# Altium footprint library PcbLib.PcbLib: 116 footprints (part 5 of 8)
Each footprint in its own frame and in the unit in brackets; x right, y up, seen from the top. Pads: shape width x height; smd on the part's side, far side on the other; paste and mask are expansions set on the pad; w line width, h text height; cw(c..) or ccw(c..) is an arc to the next point about the centre after c.
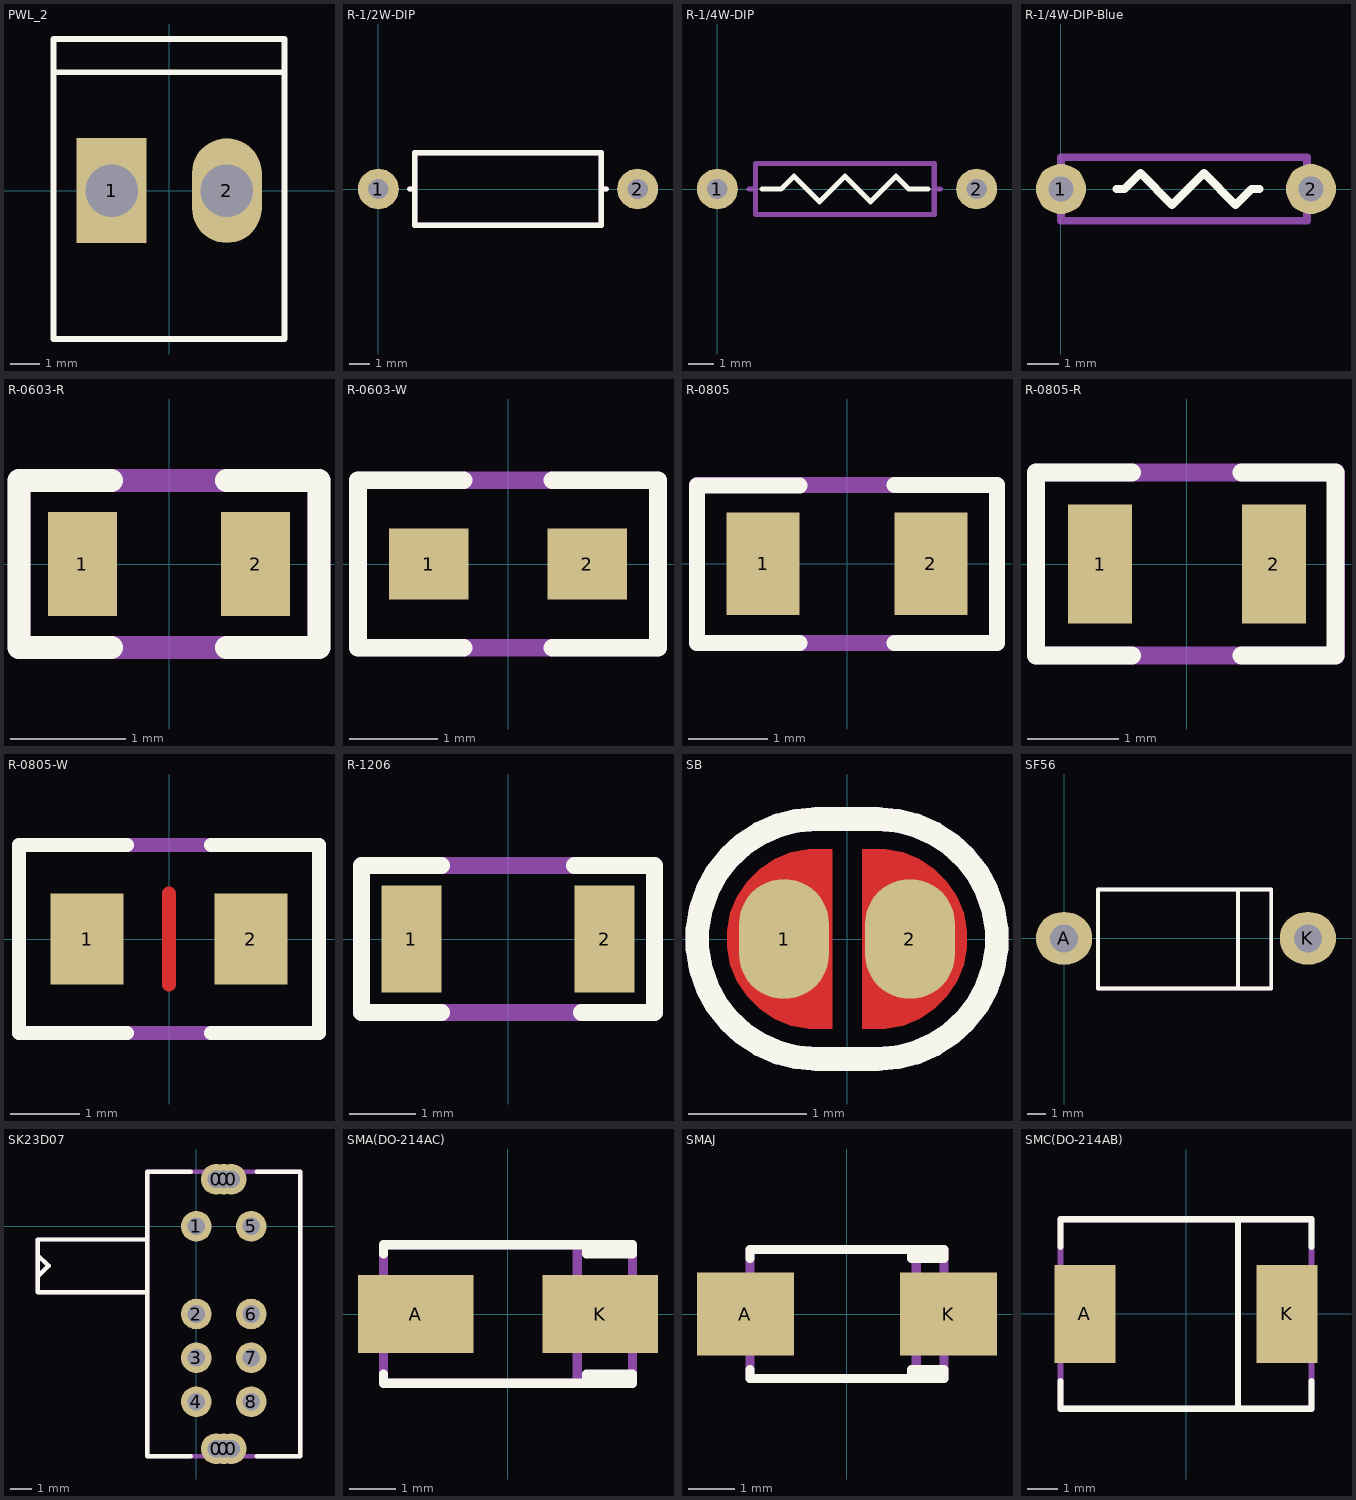
[diagram p4: the footprints below, top view; thin cyan lines are the x and y axes]

## PWL_2 [mm] "Connector; Header; 2 Position"
height 0.001
pads (2):
  rect 2.4x3.6 hole 1.8: 1(-1.98,0)
  oval 2.4x3.6 hole 1.8: 2(1.98,0)
Top Overlay:
  lines w0.2: -3.98,4.064 3.96,4.064 ; -3.98,-5.1 -3.98,5.207 3.96,5.207 3.96,-5.1 -3.98,-5.1
3D body "PWL-2.stp": height 13.5, standoff -4, extent -3.96,-5 3.96,5

## R-1/2W-DIP [mm]
pads (2):
  round 2 hole 1: 1(0,0) 2(12.7,0)
Top Overlay:
  lines w0.254: 1.524,0 1.778,0 ; 10.922,0 11.176,0 ; 1.778,-1.778 10.922,-1.778 10.922,1.778 1.778,1.778 1.778,-1.778
Mechanical 29:
  lines w0.254: 1.524,0 1.778,0 ; 10.922,0 11.176,0 ; 1.778,-1.778 10.922,-1.778 10.922,1.778 1.778,1.778 1.778,-1.778
  text ".Designator" at 4.518,-0.483 h1
3D body "User Library-Res50-Axial 0_5W-22R.step": height 4.38, standoff -5, extent -0.375,-1.875 13.075,1.875

## R-1/4W-DIP [mm]
pads (2):
  round 1.6 hole 0.8 paste+0 mask+0.04: 1(0,0) 2(10.16,0)
Top Overlay:
  lines w0.2: 1.75,0 2.5,0 3,0.5 4,-0.5 ; 8.25,0 7.5,0 ; 4,-0.5 5,0.5 6,-0.5 ; 4,-0.5 4,-0.5 ; 6,-0.5 7,0.5 7.5,0 ; 6,-0.5 6,-0.5 ; 7.5,0 7.5,0
Mechanical 29:
  lines w0.2: 1.25,0 1.5,0 ; 8.5,0 8.75,0 ; 1.5,-1 1.5,1 8.5,1 8.5,-1 1.5,-1
  text ".Designator" at 3.45,-0.467 h1
3D body "User Library-RESISTOR, 0_25 W, 0_4 IN LEAD PITCH.step": height 2.93, standoff -2.54, extent -0.305,-1.156 10.465,1.156

## R-1/4W-DIP-Blue [mm]
pads (2):
  round 1.6 hole 0.8 paste+0 mask+0.04: 1(0,0) 2(8,0)
Top Overlay:
  lines w0.254: 1.778,0 2.032,0 2.54,0.508 3.556,-0.508 4.572,0.508 5.588,-0.508 6.096,0 6.35,0
Mechanical 29:
  lines w0.254: 0,-1.016 7.874,-1.016 7.874,1.016 1.778,1.016 0,1.016 0,-1.016
  text ".Designator" at 1.978,-0.483 h1
3D body "10KR.STEP": height 2.6, standoff -1.11, extent 0.015,-1.1 7.985,1.1

## R-0603-R [mm]
pads (2):
  rect 0.6x0.9 smd: 1(-0.75,0) 2(0.75,0)
Top Overlay:
  lines w0.2: -0.5,-0.725 -1.3,-0.725 -1.3,0.725 -0.5,0.725 ; 0.5,-0.725 1.3,-0.725 1.3,0.725 0.5,0.725
Mechanical 29:
  lines w0.2: -1.3,-0.725 1.3,-0.725 1.3,0.725 -1.3,0.725 -1.3,-0.725
  text ".Designator" at -1.05,-0.467 h1
3D body "RES0603.stp": height 0.45, standoff 0, extent -0.8,-0.4 0.8,0.4

## R-0603-W [mm]
pads (2):
  rect 0.9x0.8 smd: 1(-0.9,0) 2(0.9,0)
Top Overlay:
  lines w0.2: -0.5,-0.95 -1.7,-0.95 -1.7,0.95 -0.5,0.95 ; 0.5,-0.95 1.7,-0.95 1.7,0.95 0.5,0.95
Mechanical 29:
  lines w0.2: -1.7,-0.95 -1.7,0.95 1.7,0.95 1.7,-0.95 -1.7,-0.95
  text ".Designator" at -1.05,-0.467 h1
3D body "RES0603.stp": height 0.45, standoff 0, extent -0.8,-0.4 0.8,0.4

## R-0805 [mm]
pads (2):
  rect 0.925x1.3 smd: 1(-1.062,0) 2(1.062,0)
Top Overlay:
  lines w0.2: -0.6,-1.002 -1.9,-1.002 -1.9,0.993 -0.6,0.993 ; 0.6,-1.002 1.9,-1.002 1.9,1 0.6,1
Mechanical 29:
  lines w0.2: -1.9,-1 1.9,-1 1.9,1 -1.9,1 -1.9,-1
  text ".Designator" at -1.05,-0.467 h1
3D body "RES0805.stp": height 0.5, standoff 0, extent -1,-0.63 1,0.62

## R-0805-R [mm]
pads (2):
  rect 0.7x1.3 smd: 1(-0.95,0) 2(0.95,0)
Top Overlay:
  lines w0.2: -0.6,-1 -1.65,-1 -1.65,1 -0.6,1 ; 0.6,-1 1.625,-1 1.625,1 0.6,1
Mechanical 29:
  lines w0.2: -1.65,-1 1.63,-1 1.63,1 -1.65,1 -1.65,-1
  text ".Designator" at -1.05,-0.467 h1
3D body "RES0805.stp": height 0.5, standoff 0, extent -1,-0.63 1,0.62

## R-0805-W [mm]
pads (2):
  rect 1.05x1.3 smd: 1(-1.175,0) 2(1.175,0)
Top Layer:
  lines w0.2: 0,-0.65 0,0.65
Top Overlay:
  lines w0.2: -0.6,-1.35 -2.15,-1.35 -2.15,1.35 -0.6,1.35 ; 0.6,-1.35 2.15,-1.35 2.15,1.35 0.6,1.35
Mechanical 29:
  lines w0.2: -2.15,-1.35 -2.15,1.35 2.15,1.35 2.15,-1.35 -2.15,-1.35
  text ".Designator" at -1.05,-0.467 h1
3D body "RES0805.stp": height 0.5, standoff 0, extent -1,-0.63 1,0.62

## R-1206 [mm]
pads (2):
  rect 0.9x1.6 smd: 1(-1.45,0) 2(1.45,0)
Top Overlay:
  lines w0.254: -1,-1.1 -2.2,-1.1 -2.2,1.1 -1,1.1 ; 1,1.1 2.2,1.1 2.2,-1.1 1.1,-1.1
Mechanical 29:
  lines w0.254: -2.2,-1.1 2.2,-1.1 2.2,1.1 -2.2,1.1 -2.2,-1.1
  text ".Designator" at -0.996,-0.163 h1
3D body "RES1206.stp": height 0.55, standoff 0, extent -1.55,-0.772 1.55,0.78

## SB [mil] "SOLDER BRIDGE NO"
pads (2):
  oval 30x40 smd mask+0: 1(-21,0) 2(21,0)
Top Layer:
  region: 5,-30 5,30 10,30 12.95,30 18.75,28.85 24.21,26.59 29.12,23.3 33.3,19.12 36.59,14.21 38.85,8.75 40,2.95 40,0 40,-2.95 38.85,-8.75 36.59,-14.21 33.3,-19.12 29.12,-23.3 24.21,-26.59 18.75,-28.85 12.95,-30 10,-30
  region: -10,-30 -12.95,-30 -18.75,-28.85 -24.21,-26.59 -29.12,-23.3 -33.3,-19.12 -36.59,-14.21 -38.85,-8.75 -40,-2.95 -40,0 -40,2.95 -38.85,8.75 -36.59,14.21 -33.3,19.12 -29.12,23.3 -24.21,26.59 -18.75,28.85 -12.95,30 -10,30 -5,30 -5,-30
Top Overlay:
  lines w7.87: -10,-40 cw(c-10,0) -10,40 10,40 cw(c10,0) 10,-40 -10,-40
Top Solder:
  rectangle: -6.5,-34.25 6.5,34.25
Mechanical 29:
  lines w7.87: -10,-40 cw(c-10,0) -10,40 10,40 cw(c10,0) 10,-40 -10,-40
  text ".Designator" at -31.06,-9.5 h19.68

## SF56 [mm]
pads (2):
  oval 3x2.8 hole 1.5: A(0,0) K(13,0)
Top Overlay:
  lines w0.2: 9.271,-2.667 9.271,2.54 ; 1.8,-2.669 1.8,2.6 11.049,2.6 11.049,-2.669 1.8,-2.669
Mechanical 29:
  lines w0.2: 9.271,-2.667 9.271,2.54 ; 1.8,-2.669 1.8,2.6 11.049,2.6 11.049,-2.669 1.8,-2.669
  text ".Designator" at 4.6,-0.267 h1

## SK23D07 [mm]
pads (14):
  round 1.4 hole 0.8: 0(0.9,-10.15) 0(0.9,2.15) 0(1.25,-10.15) 0(1.25,2.15) 0(1.6,-10.15) 0(1.6,2.15) 1(0,0) 2(0,-4) 3(0,-6) 4(0,-8) 5(2.5,0) 6(2.5,-4) 7(2.5,-6) 8(2.5,-8)
Top Overlay:
  lines w0.2: -7.25,-2.3 -6.75,-1.8 -7.25,-1.3 ; -2.25,-3 -7.25,-3 -7.25,-0.6 -2.25,-0.6 ; -0.25,-10.5 -2.25,-10.5 -2.25,2.5 -0.25,2.5 ; 2.75,-10.5 4.75,-10.5 4.75,2.5 2.75,2.5 ; -7.25,-1.3 -7.25,-1.3
Mechanical 29:
  lines w0.2: -7.25,-2.3 -6.75,-1.8 -7.25,-1.3 ; -2.25,-3 -7.25,-3 -7.25,-0.6 -2.25,-0.6 ; -7.25,-1.3 -7.25,-1.3 ; -2.25,-10.5 -2.25,2.5 4.75,2.5 4.75,-10.5 -2.25,-10.5
  text ".Designator" at 1.717,-5.8 h1
3D body "SK23D07.STEP": height 4.8, standoff -2.4, extent -7.175,-10.325 4.625,2.375

## SMA(DO-214AC) [mm]
pads (2):
  rect 2.5x1.7 smd: A(-2,0) K(2,0)
Top Overlay:
  lines w0.2: -2.7,-1.3 -2.7,-1.5 2.7,-1.5 2.7,-1.3 1.7,-1.3 1.7,-1.5 ; -2.7,1.3 -2.7,1.5 2.7,1.5 2.7,1.3 1.7,1.3 1.7,1.5 ; 1.7,-1.4 2.7,-1.4 ; 1.7,1.4 2.7,1.4
Mechanical 29:
  lines w0.2: 1.5,-1.5 1.5,1.5 ; -2.7,-1.5 2.7,-1.5 2.7,1.5 -2.7,1.5 -2.7,-1.5
  text ".Designator" at -1.4,-0.267 h1
3D body "User Library-SMAJ.step": height 2, standoff 0.01, extent -2.465,-1.27 2.465,1.27

## SMAJ [mm]
pads (2):
  rect 2.1x1.8 smd: A(-2.2,0) K(2.2,0)
Top Overlay:
  lines w0.2: -2.1,-1.2 -2.1,-1.4 2.1,-1.4 2.1,-1.2 1.4,-1.2 1.4,-1.4 ; -2.1,1.2 -2.1,1.4 2.1,1.4 2.1,1.2 1.4,1.2 1.4,1.4 ; 1.4,-1.3 2.1,-1.3 ; 1.4,1.3 2.1,1.3
Mechanical 29:
  lines w0.2: 1.5,-1.4 1.5,1.4 ; -2.1,-1.4 -2.1,1.4 2.1,1.4 2.1,-1.4 -2.1,-1.4
  text ".Designator" at -1.2,-0.367 h1
3D body "User Library-SMAJ.step": height 2, standoff 0.01, extent -2.465,-1.27 2.465,1.27

## SMC(DO-214AB) [mm]
pads (2):
  rect 2x3.2 smd: A(-3.305,0) K(3.305,0)
Top Overlay:
  lines w0.2: -4.1,-2.2 -4.1,-3.1 4.1,-3.1 4.1,-2.2 ; -4.1,2.2 -4.1,3.1 4.1,3.1 4.1,2.2 ; 1.7,-3.1 1.7,3.1
Mechanical 29:
  lines w0.2: 1.7,-3.1 1.7,3.1 ; -4.1,-3.1 -4.1,3.1 4.1,3.1 4.1,-3.1 -4.1,-3.1
  text ".Designator" at -1.2,-0.467 h1
3D body "SS34.STEP": height 2.5, standoff 0, extent -3.95,-2.9 3.95,2.9